# Altium footprint library bethu.PcbLib: 628 footprints (part 6 of 40)
Each footprint in its own frame and in the unit in brackets; x right, y up, seen from the top. Pads: shape width x height; smd on the part's side, far side on the other; paste and mask are expansions set on the pad; w line width, h text height; cw(c..) or ccw(c..) is an arc to the next point about the centre after c.
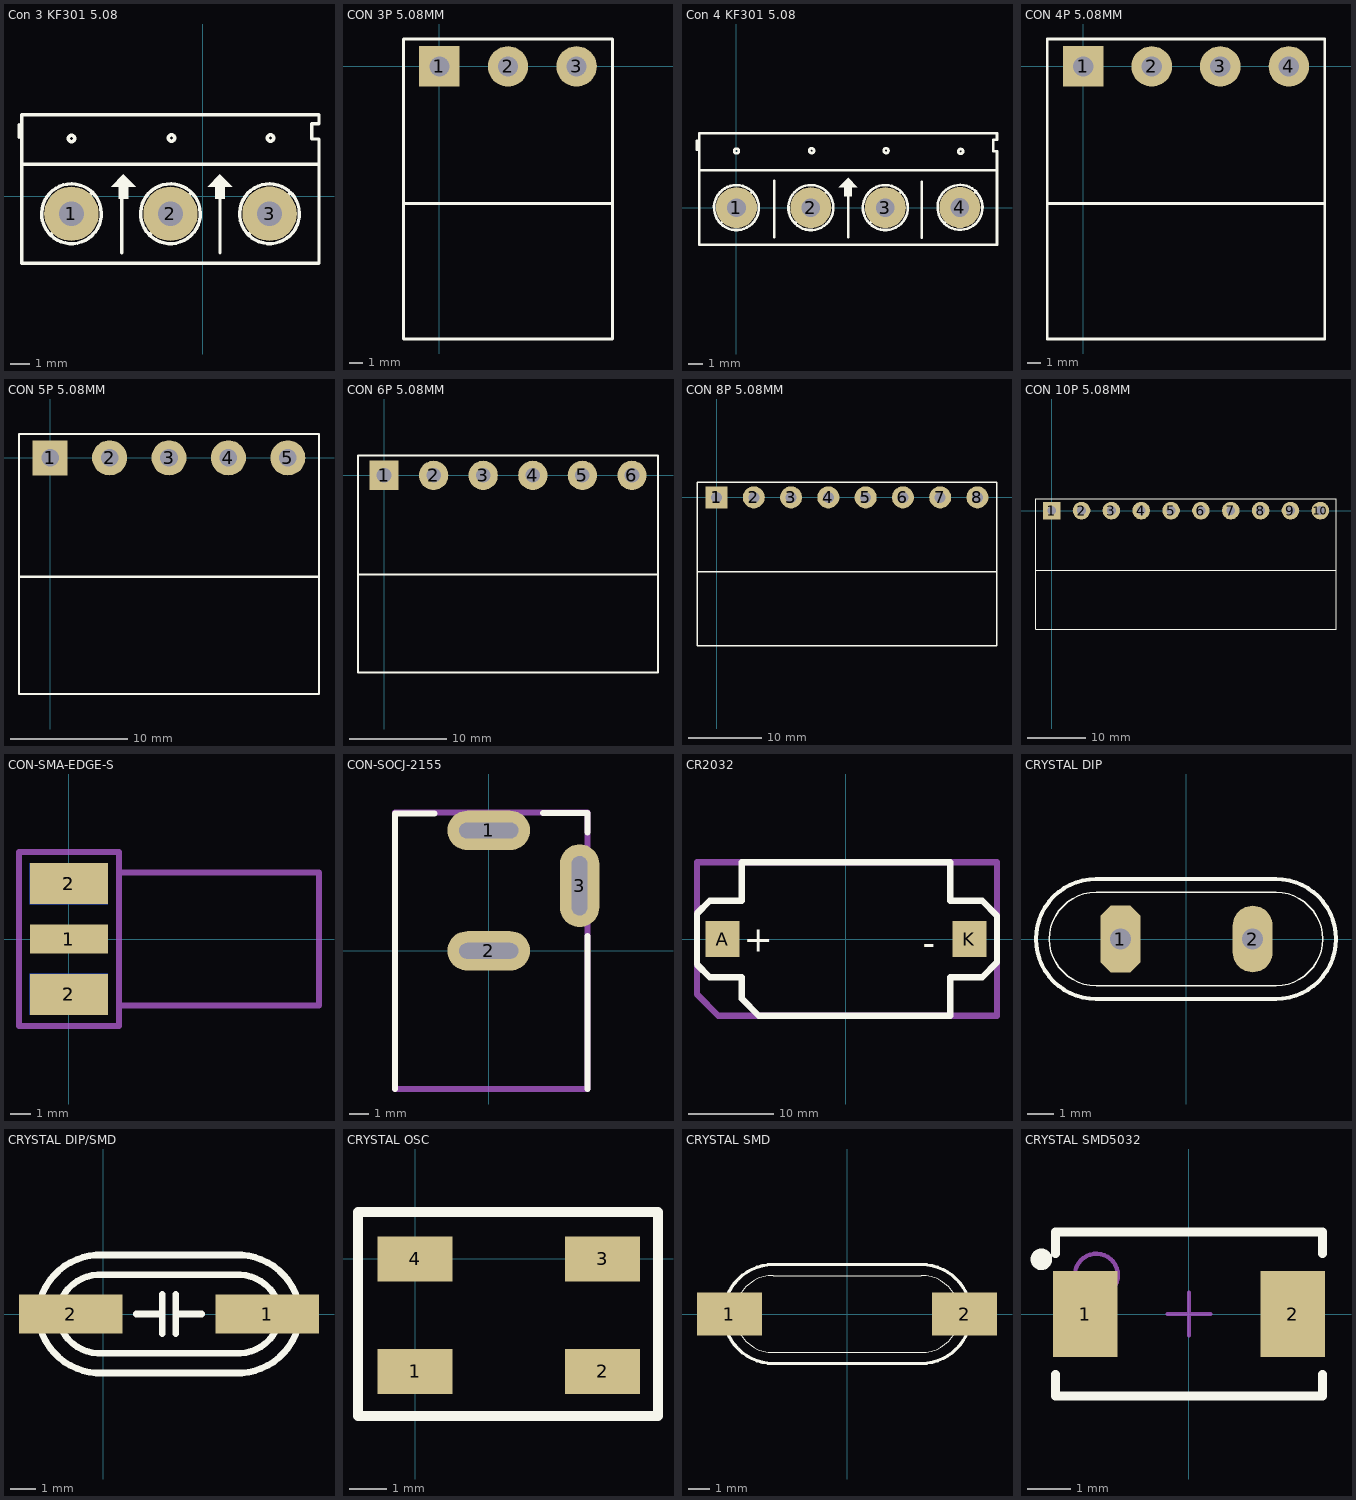
[diagram p5: the footprints below, top view; thin cyan lines are the x and y axes]

## Con 3 KF301 5.08 [mil]
pads (3):
  round 110 hole 50: 1(-265,-35) 2(-65,-35) 3(135.06,-34.94)
Top Overlay:
  circle w7: c137,118 r6.4
  circle w7: c-265,117 r6.4
  circle w7: c-63,118 r6.4
  region: -160,45 -185,20 -170,20 -170,-5 -150,-5 -150,20 -135,20
  region: 35,45 10,20 25,20 25,-5 45,-5 45,20 60,20
  lines w7: -371,120 -371,145 ; -365,65 230,65 ; -307,-77 -222,8 ; -225.96,11.05 ccw(c-265,-35) -219.82,5.05 ; -163,-114 -163,37 ; -107,-77 -22.5,7.5 ; -25.24,10.44 ccw(c-65,-35) -19.82,5.05 ; 35,-114 35,5 ; 93.5,-76.5 177.5,7.5 ; 174.27,10.97 ccw(c135.06,-34.94) 180.19,5.17 ; -365,-135 235,-135 235,116 220,116 220,147 235,147 235,165 -365,165 -365,15 -365,-135
3D body "KF301-5-3P_v1.step": height 145.67, standoff -411.89, extent -369.17,-193 235.17,106.21

## CON 3P 5.08MM [mm] "Connector; Header; 3 Position"
pads (3):
  rect 3x3 hole 1.5: 1(0,0)
  round 3 hole 1.5: 2(5.08,0) 3(10.16,0)
Top Overlay:
  lines w0.2: -2.667,-10.16 12.827,-10.16 ; -2.667,-20.193 -2.667,2.032 12.827,2.032 12.827,-20.193 -2.667,-20.193
3D body "14032.stp": height 15.17, standoff 0.17, extent -2.54,-20.105 12.7,-1.905
3D body "User Library-MSTB 2,5-3-G-5,08 1759020.STEP": height 8.6, standoff -3.5, extent -2.54,-10.065 12.7,1.937

## Con 4 KF301 5.08 [mil]
pads (4):
  round 110 hole 50: 1(0,0) 2(200,0) 3(400.06,0.06) 4(600.39,0.39)
Top Overlay:
  circle w7: c202,153 r6.4
  circle w7: c0,152 r6.4
  circle w7: c402,153 r6.4
  circle w7: c602.6,151 r6.4
  region: 300,80 275,55 290,55 290,30 310,30 310,55 325,55
  lines w7: -106,155 -106,180 ; -100,100 700,100 ; -42,-42 43,43 ; 39.04,46.05 ccw(c0,0) 45.18,40.05 ; 102,-79 102,72 ; 158,-42 242.5,42.5 ; 239.76,45.44 ccw(c200,0) 245.18,40.05 ; 300,-79 300,40 ; 358.5,-41.5 442.5,42.5 ; 439.27,45.97 ccw(c400.06,0.06) 445.19,40.17 ; 497.97,-81.03 497.97,69.97 ; 559,-41 643.5,43.5 ; 640.16,46.18 ccw(c600.59,0.59) 646.12,40.23 ; -100,-100 -100,50 -100,200 700,200 700,182 690,182 690,151 700,151 700,-100 -100,-100
3D body "terminal_blocks_a-tb500-ta04.stp": height 496.57, standoff -145.15, extent -115.51,-156 695.51,198.33

## CON 4P 5.08MM [mm] "Connector; Header; 4 Position"
pads (4):
  rect 3x3 hole 1.5: 1(0,0)
  round 3 hole 1.5: 2(5.08,0) 3(10.16,0) 4(15.24,0)
Top Overlay:
  lines w0.2: -2.667,-10.16 17.907,-10.16 ; -2.667,-20.193 -2.667,2.032 17.907,2.032 17.907,-20.193 -2.667,-20.193
3D body "14033.stp": height 15.17, standoff 0.17, extent -2.54,-20.105 17.78,-1.905
3D body "User Library-MSTB 2,5-4-G-5,08 1759033.STEP": height 8.6, standoff -3.5, extent -2.54,-10.065 17.78,1.937

## CON 5P 5.08MM [mm] "Connector; Header; 5 Position"
pads (5):
  rect 3x3 hole 1.5: 1(0,0)
  round 3 hole 1.5: 2(5.08,0) 3(10.16,0) 4(15.24,0) 5(20.32,0)
Top Overlay:
  lines w0.2: -2.667,-10.16 22.987,-10.16 ; -2.667,-20.193 22.987,-20.193 22.987,2.032 -2.667,2.032 -2.667,-20.193
3D body "14034.stp": height 15.17, standoff 0.17, extent -2.54,-20.105 22.86,-1.905
3D body "User Library-MSTB 2,5-5-G-5,08 1759046.STEP": height 8.6, standoff -3.5, extent -2.54,-10.065 22.86,1.937

## CON 6P 5.08MM [mm] "Connector; Header; 6 Position"
pads (6):
  rect 3x3 hole 1.5: 1(0,0)
  round 3 hole 1.5: 2(5.08,0) 3(10.16,0) 4(15.24,0) 5(20.32,0) 6(25.4,0)
Top Overlay:
  lines w0.2: -2.667,-10.16 28.067,-10.16 ; -2.667,-20.193 28.067,-20.193 28.067,2.032 -2.667,2.032 -2.667,-20.193
3D body "User Library-MSTB 2,5-2-G-5,08 1770711.STEP": height 8.6, standoff -3.5, extent 17.78,-10.063 27.94,1.939
3D body "14035.stp": height 15.17, standoff 0.17, extent -2.54,-20.105 27.94,-1.905
3D body "User Library-MSTB 2,5-4-G-5,08 1759033.STEP": height 8.6, standoff -3.5, extent -2.54,-10.065 17.78,1.937

## CON 8P 5.08MM [mm] "Connector; Header; 8 Position"
pads (8):
  rect 3x3 hole 1.5: 1(0,0)
  round 3 hole 1.5: 2(5.08,0) 3(10.16,0) 4(15.24,0) 5(20.32,0) 6(25.4,0) 7(30.48,0) 8(35.56,0)
Top Overlay:
  lines w0.2: -2.667,-10.16 38.227,-10.16 ; -2.667,-20.193 38.227,-20.193 38.227,2.032 -2.667,2.032 -2.667,-20.193
3D body "User Library-MSTB 2,5-4-G-5,08 1759033.STEP": height 8.6, standoff -3.5, extent 17.78,-10.063 38.1,1.939
3D body "User Library-MSTB 2,5-4-G-5,08 1759033.STEP": height 8.6, standoff -3.5, extent -2.54,-10.065 17.78,1.937
3D body "14033.stp": height 15.17, standoff 0.17, extent -2.54,-20.105 17.78,-1.905
3D body "14033.stp": height 15.17, standoff 0.17, extent 17.78,-20.105 38.1,-1.905

## CON 10P 5.08MM [mm] "Connector; Header; 10 Position"
pads (10):
  rect 3x3 hole 1.5: 1(0,0)
  round 3 hole 1.5: 2(5.08,0) 3(10.16,0) 4(15.24,0) 5(20.32,0) 6(25.4,0) 7(30.48,0) 8(35.56,0) 9(40.64,0) 10(45.72,0)
Top Overlay:
  lines w0.2: -2.667,-10.16 48.387,-10.16 ; -2.667,-20.193 -2.667,2.032 48.387,2.032 48.387,-20.193 -2.667,-20.193
3D body "14038.stp": height 15.17, standoff 0.17, extent -2.54,-20.105 48.26,-1.905
3D body "User Library-MSTB 2,5-10-G-5,08 1759091.STEP": height 8.6, standoff -3.5, extent -2.54,-10.065 48.26,1.937

## CON-SMA-EDGE-S [mm]
pads (5):
  rect 3.8x1.4 smd mask+0.07: 1(0,0)
  rect 3.8x2 smd mask+0.07: 2(0,-2.7) 2(0,2.7)
  rect 3.8x2 smd far side mask+0.07: 2(0,-2.7) 2(0,2.7)
Mechanical 13:
  lines w0.3: 2.45,-3.25 12.2,-3.25 12.2,3.25 2.45,3.25 ; -2.433,-4.25 2.45,-4.25 2.45,-4 2.45,4.25 -2.433,4.25 -2.433,-4.25
  text "'.Designator'" at -5.84,-0.925 h1
3D body "CON-SMA-EDGE-S.step": height 3.64, standoff -2.71, extent -1.16,-3.175 12.17,3.175

## CON-SOCJ-2155 [mm]
pads (3):
  oval 4.2x2 hole 0.8 slot 3 at 0 deg: 1(0,6.1) 2(0,0)
  oval 2x4.2 hole 0.8 slot 3 at 90 deg: 3(4.6,3.3)
Top Overlay:
  lines w0.3: -4.75,-7 -4.75,6.95 -2.75,6.95 ; 2.75,6.976 5,6.976 5,6 ; 5,-7 5,0.75
Mechanical 13:
  lines w0.3: -4.75,-7 -4.75,7 5,7 5,-7 -4.75,-7
  text "'.Designator'" at -5.665,-0.417 h1
3D body "CON-SOCJ-2155.STEP": height 11.11, standoff -4.29, extent -4.5,-7.5 4.75,6.6

## CR2032 [mm]
pads (2):
  rect 4x4.2 smd: A(-14.5,0) K(14.5,0)
Top Overlay:
  lines w0.75: -17.5,-3 -16,-4.5 -12.25,-4.5 -12.25,-7 -10.25,-9 12.25,-9 12.25,-4.5 16,-4.5 17.75,-2.75 17.75,2.75 16,4.5 12.25,4.5 12.25,9 -12.25,9 -12.25,4.5 -16,4.5 -17.5,3 -17.5,-3
  text "+" at -12,-1.5 h3
  text "-" at 9,-1.9 h3
Mechanical 13:
  lines w0.75: -17.5,-0.75 -17.5,9 17.75,9 17.75,-9 -15,-9 -17.5,-6.5 -17.5,3.25
  text "-" at 13.2,-1.9 h3
  text "+" at -15.8,-1.4 h3
  text "'.Designator'" at -11.88,-1.8 h2
3D body "CR2032_Holder.STEP": height 5.61, standoff 0.01, extent -16.1,-8 16.1,8

## CRYSTAL DIP [mm]
pads (2):
  oct 1.524x2.54 hole 0.8: 1(-2.5,0)
  oval 1.524x2.54 hole 0.8: 2(2.54,0)
Top Overlay:
  lines w0.051: -3.429,-1.778 cw(c-3.429,0) -3.429,1.778 3.429,1.778 cw(c3.429,0) 3.429,-1.778 -3.429,-1.778
  lines w0.152: -3.429,-2.286 cw(c-3.429,0) -3.429,2.286 3.429,2.286 cw(c3.429,0) 3.429,-2.286 -3.429,-2.286
3D body "SW3dPS-HP49US.STEP": height 3.5, standoff -4, extent -5.625,-2.35 5.725,2.3

## CRYSTAL DIP/SMD [mm]
pads (2):
  rect 4x1.524 smd: 1(6.35,0) 2(-1.27,0)
Top Overlay:
  lines w0.254: 1.27,0 1.524,0 2.286,0 ; 2.286,-0.762 2.286,0.762 ; 2.794,-0.762 2.794,0.762 ; 2.794,0 3.81,0 3.048,0 ; -2.54,0 cw(c-0.127,-0.127) 0,2.286 5.08,2.286 cw(c5.207,-0.127) 7.62,0 cw(c5.207,0.127) 5.08,-2.286 0,-2.286 cw(c-0.127,0.127) -2.54,0 ; -1.778,0 cw(c-0.127,-0.127) 0,1.524 5.08,1.524 cw(c5.207,-0.127) 6.858,0 cw(c5.207,0.127) 5.08,-1.524 0,-1.524 cw(c-0.127,0.127) -1.778,0
3D body "User Library-HC-49_LT_THT.STEP": height 3.6, standoff -1.99, extent -3.135,-2.325 8.215,2.325

## CRYSTAL OSC [mm]
pads (4):
  rect 2x1.2 smd: 1(0,-3) 2(5,-3) 3(5,0) 4(0,0)
Top Overlay:
  lines w0.254: -1.524,-4.191 -1.524,1.25 6.477,1.25 6.477,-4.191 -1.524,-4.191
3D body "User Library-ABMM2.STEP": height 1.21, standoff 0, extent -0.46,-3.324 5.54,0.276

## CRYSTAL SMD [mm]
pads (2):
  rect 3x2 smd: 1(-5.45,0) 2(5.425,0)
Top Overlay:
  lines w0.051: -3.429,-1.778 cw(c-3.429,0) -3.429,1.778 3.429,1.778 cw(c3.429,0) 3.429,-1.778 -3.429,-1.778
  lines w0.152: -3.429,-2.286 cw(c-3.429,0) -3.429,2.286 3.429,2.286 cw(c3.429,0) 3.429,-2.286 -3.429,-2.286
3D body "CRISTAL DE MONTAJEhcm49.STEP": height 4.24, standoff 0, extent -6.075,-2.375 6.325,2.455

## CRYSTAL SMD5032 [mm]
pads (2):
  rect 1.5x2 smd: 1(-2.413,0) 2(2.413,0)
Top Overlay:
  circle w0.25: c-3.427,1.27 r0.125
  lines w0.2: -3.1,-1.397 -3.1,-1.905 0.875,-1.905 ; -3.1,1.397 -3.1,1.905 0.875,1.905 ; -0.875,-1.905 3.1,-1.905 3.1,-1.397 ; -0.875,1.905 3.1,1.905 3.1,1.397
Mechanical 13:
  circle w0.1: c-2.15,0.9 r0.5
Mechanical 15:
  lines w0.1: -0.5,0 0.5,0 ; 0,-0.5 0,0.5
3D body "User Library-ABM3-1.STEP": height 1.3, standoff 0, extent -2.5,-1.6 2.5,1.6